# Altium footprint library chenjd.PcbLib: 87 footprints (part 1 of 6)
Each footprint in its own frame and in the unit in brackets; x right, y up, seen from the top. Pads: shape width x height; smd on the part's side, far side on the other; paste and mask are expansions set on the pad; w line width, h text height; cw(c..) or ccw(c..) is an arc to the next point about the centre after c.
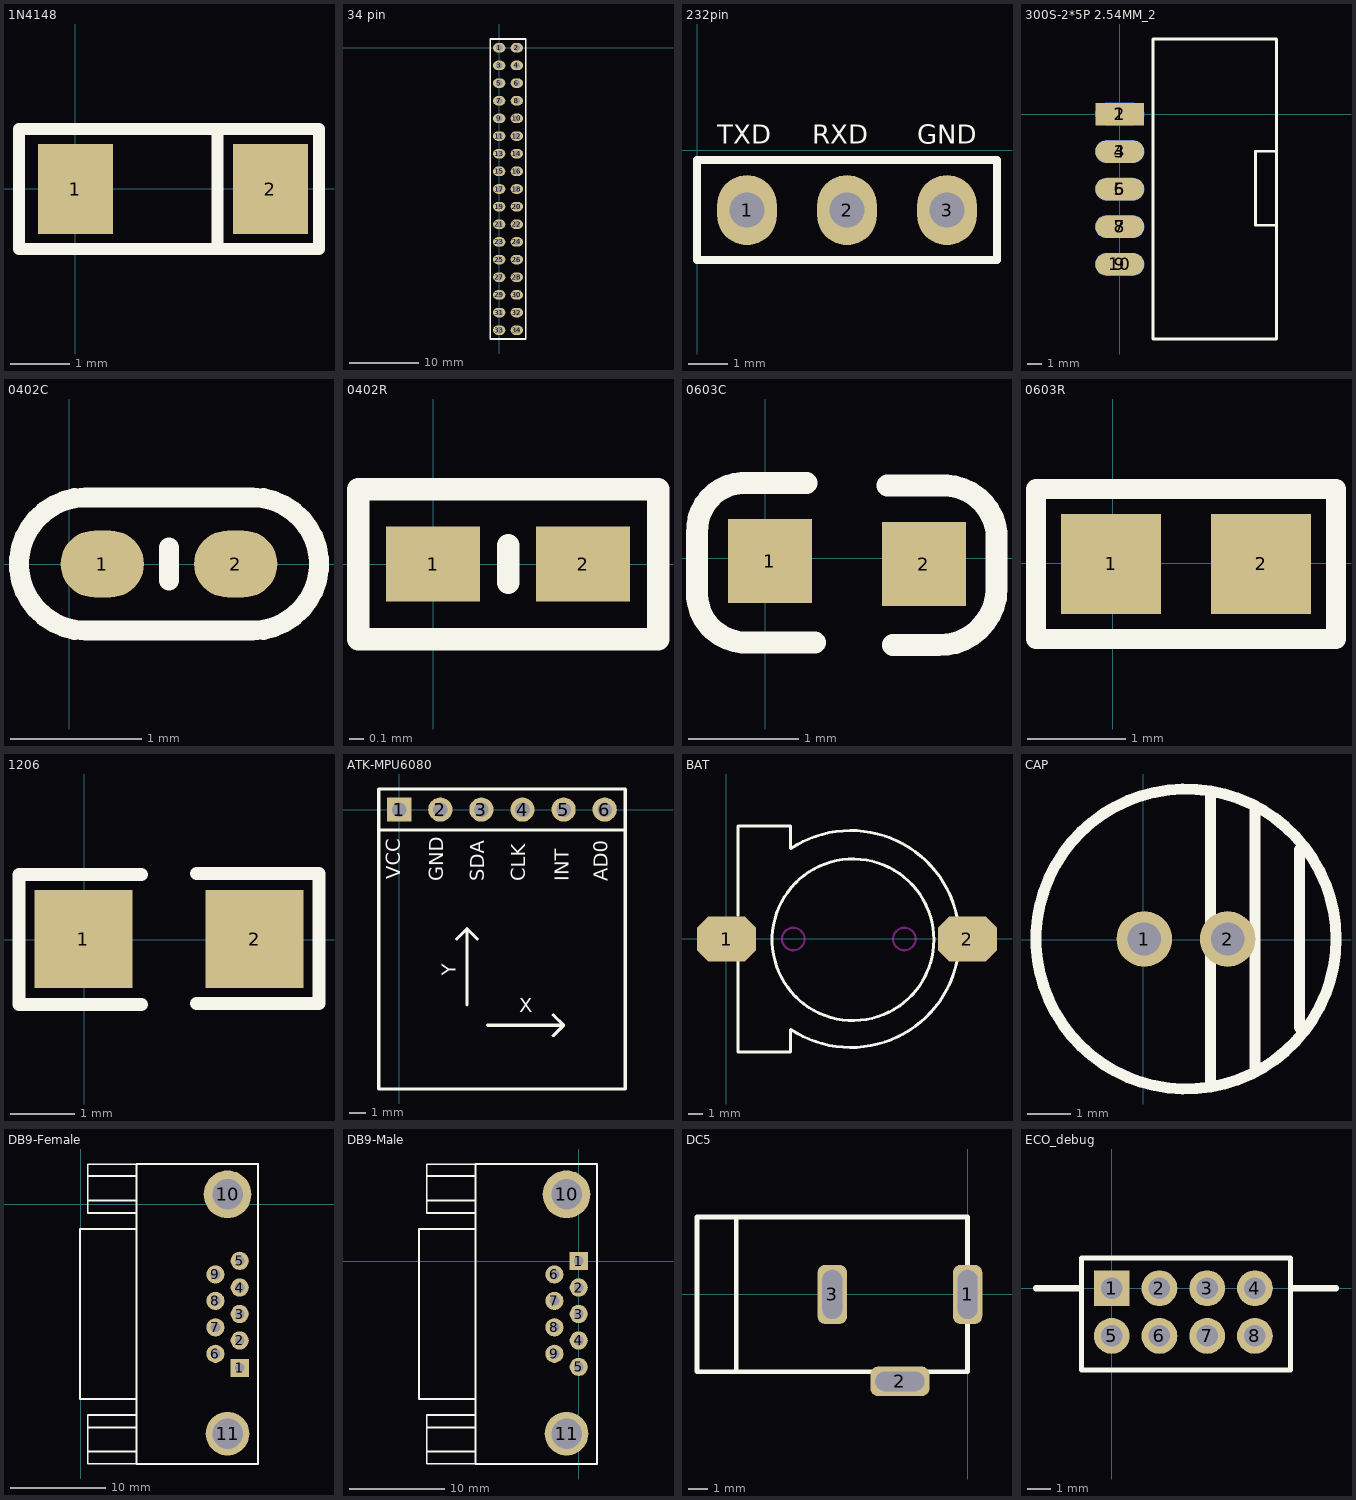
[diagram p0: the footprints below, top view; thin cyan lines are the x and y axes]

## 1N4148 [mil]
pads (2):
  rect 50x60 smd: 1(0.14,-0.15) 2(130.15,-0.15)
Top Overlay:
  lines w8: 95.14,-40.15 95.14,39.85 ; -37.35,-40.15 -37.35,39.85 162.65,39.85 162.65,-40.15 -37.35,-40.15
3D body "1N4148.STEP": height 51.25, standoff 3.87, extent -25,-23.69 152.17,23.69

## 34 pin [mil] "ALINETEK LCD 接口"
pads (34):
  oval 70x54 hole 35: 1(0,0) 2(100,0) 3(0,-100) 4(100,-100) 5(0,-200) 6(100,-200) 7(0,-300) 8(100,-300) 9(0,-400) 10(100,-400) 11(0,-500) 12(100,-500) 13(0,-600) 14(100,-600) 15(0,-700) 16(100,-700) 17(0,-800) 18(100,-800) 19(0,-900) 20(100,-900) 21(0,-1000) 22(100,-1000) 23(0,-1100) 24(100,-1100) 25(0,-1200) 26(100,-1200) 27(0,-1300) 28(100,-1300) 29(0,-1400) 30(100,-1400) 31(0,-1500) 32(100,-1500) 33(0,-1600) 34(100,-1600)
Top Overlay:
  lines w10: -50,-1650 -50,50 150,50 150,-1650 -50,-1650
3D body "4PIN--yellow.STEP": height 452.76, standoff -118.11, extent 50,-350 150,50
3D body "4PIN--yellow.STEP": height 452.76, standoff -118.11, extent 50,-750 150,-350
3D body "4PIN--yellow.STEP": height 452.76, standoff -118.11, extent -50,-350 50,50
3D body "4PIN--yellow.STEP": height 452.76, standoff -118.11, extent -50,-750 50,-350
3D body "4PIN--yellow.STEP": height 452.76, standoff -118.11, extent -44.99,-1640 55.01,-1240
3D body "4PIN--yellow.STEP": height 452.76, standoff -118.11, extent 55,-1640 155,-1240
3D body "4PIN--yellow.STEP": height 452.76, standoff -118.11, extent 55,-1240 155,-840
3D body "4PIN--yellow.STEP": height 452.76, standoff -118.11, extent -45,-1240 55,-840

## 232pin [mil]
pads (3):
  oval 60x70 hole 35: 1(50,-60) 2(150,-60) 3(250,-60)
Top Overlay:
  lines w8: 0,-110 300,-110 300,-10 0,-10 0,-110
  text "TXD" at 20,0 h32.44
  text "RXD" at 115,0 h32.44
  text "GND" at 220,0 h32.44
3D body "3PIN--2_54mm_.STEP": height 452.76, standoff -118.11, extent 0,-115 300,-15

## 300S-2*5P 2.54MM_2 [mil] "2.54mm 2*5P 直 简牛"
height 62.99
pads (10):
  rect 130x60 smd: 1(0,0)
  oval 130x60 smd far side: 2(0,0) 4(0,-100) 6(0,-200) 8(0,-300) 10(0,-400)
  oval 130x60 smd: 3(0,-100) 5(0,-200) 7(0,-300) 9(0,-400)
Top Overlay:
  lines w7.87: 89,-599 418,-599 ; 89,200 418,200 ; 418,-296 361,-296 361,-99 418,-99
  lines w8: 89,-599 89,200 ; 418,-599 418,200
3D body "BH-10__64BH-10.STEP": height 168.5, standoff -197.64, extent -50.38,-603.54 426,203.54

## 0402C [mil]
pads (2):
  oval 25x20 smd: 1(10,0) 2(50,0)
Top Overlay:
  lines w6: 30,-5 30,5 ; 5,-20 cw(c5,0) 5,20 55,20 cw(c55,0) 55,-20 5,-20

## 0402R [mil]
pads (2):
  rect 25x20 smd: 1(0,0) 2(40,0)
Top Overlay:
  lines w6: 20,-5 20,5 ; -20,-20 -20,20 60,20 60,-20 -20,-20

## 0603C [mil] "0603电容"
pads (2):
  rect 30x30 smd: 1(1.7,-1.11) 2(56.7,-2.11)
Top Overlay:
  lines w7.87: 14.7,26.89 -8.3,26.89 ccw(c-7.3,9.89) -24.3,8.89 -24.3,-11.11 ccw(c-6.8,-12.61) -8.3,-30.11 17.7,-30.11 ; 43.7,25.89 61.7,25.89 cw(c63.7,6.89) 82.7,8.89 82.7,-11.11 cw(c62.2,-10.61) 61.7,-31.11 45.7,-31.11
3D body "0603 SMD Capacitor.STEP": height 11.89, standoff 0, extent 0,-15.75 63,15.75

## 0603R [mil] "0603电阻封装"
pads (2):
  rect 40x40 smd: 1(-0.68,-0.23) 2(59.32,-0.23)
Top Overlay:
  lines w8: -30.68,-30.23 -30.68,29.77 89.32,29.77 89.32,-30.23 -30.68,-30.23
3D body "R0603.STEP": height 17.72, standoff 0, extent -1.49,-15.74 61.5,15.75

## 1206 [mil]
pads (2):
  rect 60x60 smd: 1(-0.48,0.32) 2(104.52,0.32)
Top Overlay:
  lines w8: 35,-40 -40,-40 -40,40 35,40 ; 69.04,-39.36 144.04,-39.36 144.04,40.64 69.04,40.64
3D body "R1206.STEP": height 23.62, standoff 0, extent -12.99,-31.49 113,31.5

## ATK-MPU6080 [mm]
pads (6):
  rect 1.5x1.5 hole 0.9: 1(0,0)
  round 1.5 hole 0.9: 2(2.54,0) 3(5.08,0) 4(7.62,0) 5(10.16,0) 6(12.7,0)
Top Overlay:
  lines w0.2: 3.556,-8.001 4.191,-7.366 ; 4.191,-12.065 4.191,-7.366 ; 4.826,-8.001 4.191,-7.366 ; 5.461,-13.335 10.16,-13.335 ; 9.525,-13.97 10.16,-13.335 ; 9.525,-12.7 10.16,-13.335 ; -1.27,-1.27 -1.27,-17.272 13.97,-17.272 13.97,-1.27 ; -1.27,-1.27 -1.27,1.27 13.97,1.27 13.97,-1.27 ; -1.27,-1.27 13.97,-1.27
  text "Y" at 3.81,-9.525 h1.52
  text "X" at 8.254,-12.827 h1.52
  text "AD0" at 13.192,-4.445 h1.52
  text "VCC" at 0.365,-4.317 h1.52
  text "GND" at 3.032,-4.445 h1.52
  text "SDA" at 5.572,-4.445 h1.52
  text "CLK" at 8.112,-4.445 h1.52
  text "INT" at 10.795,-4.445 h1.52

## BAT [mm] "RTC电源"
pads (2):
  oct 4x3.048 smd: 1(0.032,-0.026) 2(16.286,-0.026)
Top Overlay:
  circle w0.203: c8.562,-0.077 r5.457
  lines w0.203: 0.792,-1.496 0.792,-7.646 4.348,-7.646 4.348,-6.122 ccw(c8.412,-0.026) 4.348,6.07 4.348,7.594 0.792,7.594 0.792,1.552
Keep-Out Layer:
  circle w0.152: c4.532,-0.026 r0.762
  circle w0.152: c12.032,-0.026 r0.762
3D body "button battery.STEP": height 1.5, standoff 0, extent 1.444,-7.192 15.575,6.939

## CAP [mil] "电解电容"
pads (2):
  round 50 hole 30: 1(0.99,0.55) 2(75.99,0.55)
Top Overlay:
  circle w10: c38.49,0.55 r135
  lines w10: 60.66,-129.15 60.66,130.85 ; 100.66,-119.15 100.66,120.85 ; 140.66,-79.15 140.66,80.85
3D body "电解电容.STEP": height 334.21, standoff -121.47, extent -106.35,-140.62 176.02,141.74

## DB9-Female [mil] "DB9-母头接口"
pads (11):
  rect 75x75 hole 40: 1(654.84,-674.72)
  round 75 hole 40: 2(654.84,-561.72) 3(654.84,-452.72) 4(654.84,-343.72) 5(654.84,-233.72) 6(554.84,-616.72) 7(554.84,-507.72) 8(554.84,-398.72) 9(554.84,-289.72)
  round 196.85 hole 126: 10(604.84,40.28)
  round 180 hole 126: 11(604.83,-945.72)
Top Overlay:
  lines w8: 28.85,-1019.72 229.84,-1019.72 ; 28.85,-919.72 229.84,-919.72 ; 28.85,15.28 229.84,15.28 ; 28.85,115.28 229.84,115.28 ; 228.48,-101.72 -2.65,-101.72 -2.65,-802.51 229.84,-802.51 ; 229.84,-1069.72 28.85,-1069.72 28.85,-868.93 229.84,-868.93 ; 229.84,-36.51 28.85,-36.51 28.85,164.28 229.84,164.28 ; 229.84,-1070.72 729.84,-1070.72 729.84,165.28 229.84,165.28 229.84,-1070.72
3D body "User Library-DB9-Usa_.STEP": height 443.9, standoff -220.47, extent 1.66,-1051.5 722.13,161.5

## DB9-Male [mil] "DB9公头接口"
pads (11):
  rect 75x75 hole 40: 1(-0.17,0.28)
  round 75 hole 40: 2(-0.17,-108.72) 3(-0.17,-217.72) 4(-0.17,-326.72) 5(-0.17,-435.72) 6(-100.17,-54.72) 7(-100.16,-163.72) 8(-100.17,-272.72) 9(-100.17,-381.72)
  round 196.85 hole 126: 10(-50.16,275.28)
  round 180 hole 126: 11(-50.17,-710.72)
Top Overlay:
  lines w8: -626.15,-784.72 -425.17,-784.72 ; -626.15,-684.72 -425.17,-684.72 ; -626.15,250.28 -425.17,250.28 ; -626.15,350.28 -425.17,350.28 ; -426.52,133.28 -657.64,133.28 -657.64,-567.51 -425.17,-567.51 ; -425.17,-834.72 -626.15,-834.72 -626.15,-633.93 -425.17,-633.93 ; -425.17,198.49 -626.15,198.49 -626.15,399.28 -425.17,399.28 ; -425.17,-835.72 74.83,-835.72 74.83,400.28 -425.17,400.28 -425.17,-835.72
3D body "COM.STEP": height 482.28, standoff -167.32, extent -804.95,-821.3 73,391.3

## DC5 [mil] "DC5电源插座"
pads (3):
  rrect50% 60x120 hole 40 slot 100 at 90 deg: 1(0,0) 3(-275.59,0)
  rrect50% 120x60 hole 40 slot 100 at 0 deg: 2(-137.8,-177.17)
Top Overlay:
  lines w10: -471.18,-157.48 -471.18,157.48 ; -551.18,-157.48 0,-157.48 0,157.48 -551.18,157.48 -551.18,-157.48
3D body "5V DC-2mm.STEP": height 440, standoff -141.73, extent -558,-196.83 12,176.08

## ECO_debug [mm] "eco调试接口"
pads (8):
  rect 1.5x1.5 hole 0.9: 1(0,0)
  round 1.5 hole 0.9: 2(2,0) 3(4,0) 4(6,0) 5(0,-2) 6(2,-2) 7(4,-2) 8(6,-2)
Top Overlay:
  lines w0.2: -1.27,-3.429 -1.27,1.27 0.635,1.27 7.493,1.27 7.493,-3.429 -1.27,-3.429
  lines w0.254: -3.175,0 -1.397,0 ; 7.62,0 9.398,0